# Altium footprint library nPOC-BB_alpha_main-boardd.PcbLib: 42 footprints (part 3 of 3)
Each footprint in its own frame and in the unit in brackets; x right, y up, seen from the top. Pads: shape width x height; smd on the part's side, far side on the other; paste and mask are expansions set on the pad; w line width, h text height; cw(c..) or ccw(c..) is an arc to the next point about the centre after c.
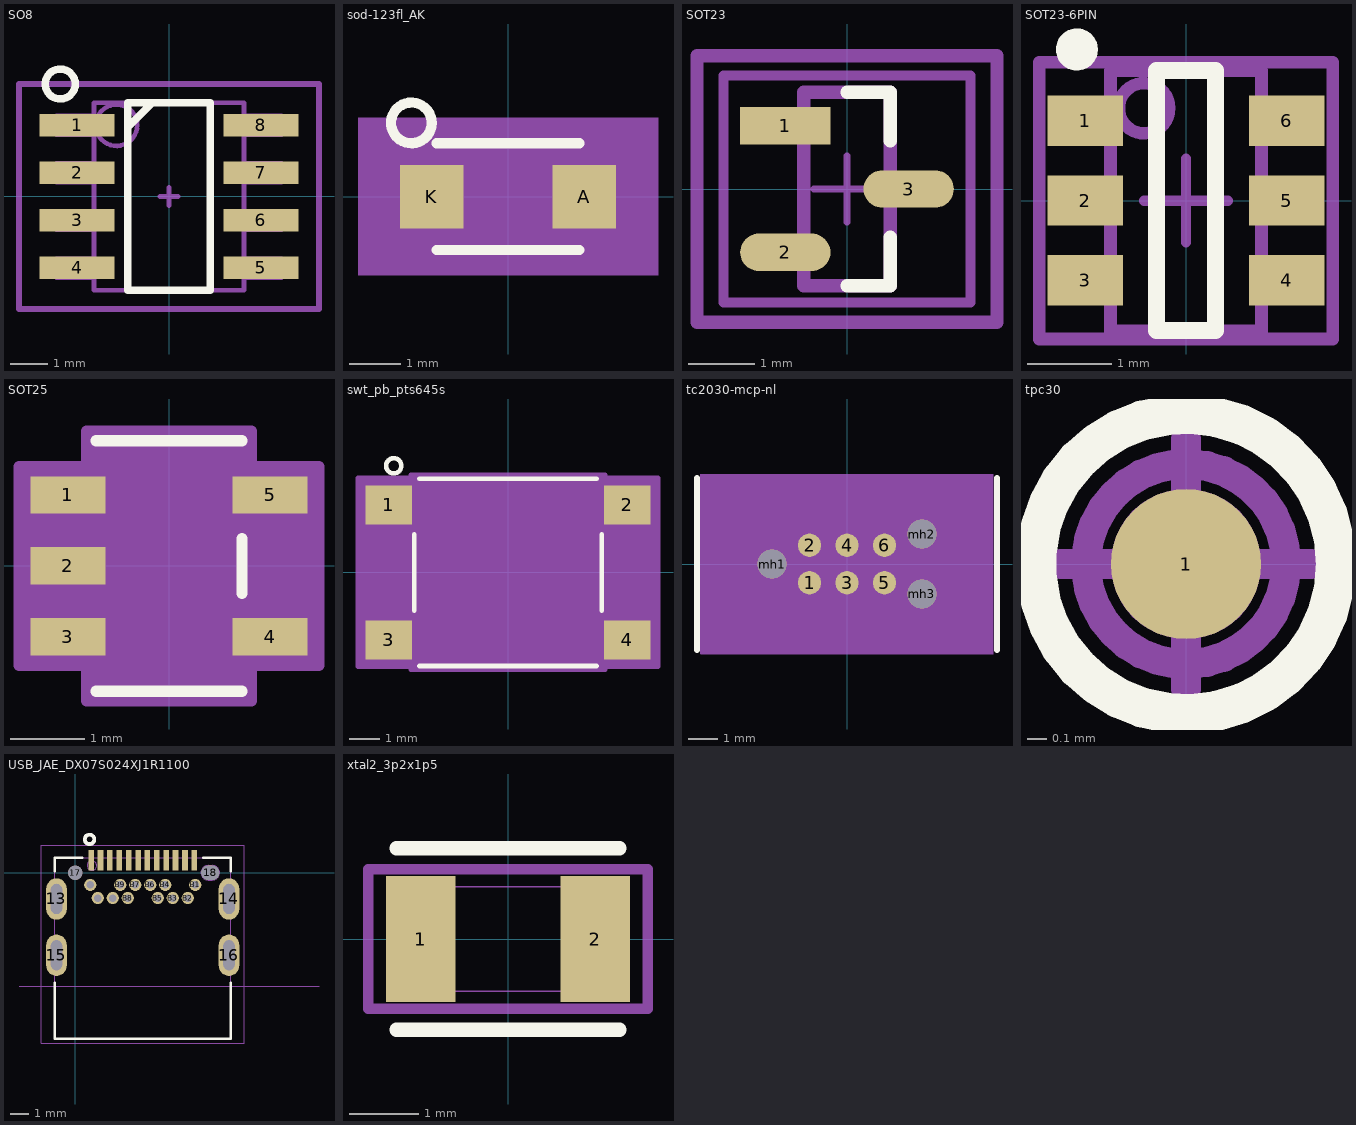
[diagram p2: the footprints below, top view; thin cyan lines are the x and y axes]

## SO8 [mm] "SOIC8"
pads (8):
  rect 2x0.6 smd: 1(-2.45,1.905) 2(-2.45,0.635) 3(-2.45,-0.635) 4(-2.45,-1.905) 5(2.45,-1.905) 6(2.45,-0.635) 7(2.45,0.635) 8(2.45,1.905)
Top Overlay:
  circle w0.2: c-2.9,3 r0.4
  lines w0.2: -1.1,1.85 -0.5,2.45 ; -1.1,-2.5 1.1,-2.5 1.1,2.5 -1.1,2.5 -1.1,-2.5
Top Assembly:
  circle w0.125: c-1.4,1.9 r0.552
  lines w0.125: -2,-2.16 -3,-2.16 -3,-1.66 -2,-1.66 ; -2,-0.89 -3,-0.89 -3,-0.39 -2,-0.39 ; -2,0.38 -3,0.38 -3,0.88 -2,0.88 ; -2,1.65 -3,1.65 -3,2.15 -2,2.15 ; 2,-2.16 3,-2.16 3,-1.66 2,-1.66 ; 2,-0.89 3,-0.89 3,-0.39 2,-0.39 ; 2,0.38 3,0.38 3,0.88 2,0.88 ; 2,1.65 3,1.65 3,2.15 2,2.15 ; -2,-2.5 2,-2.5 2,2.5 -2,2.5 -2,-2.5
Top Component Center:
  lines w0.125: -0.25,0 0.25,0 ; 0,-0.25 0,0.25
Top Courtyard:
  lines w0.15: -4,-3 4,-3 4,3 -4,3 -4,-3
3D body "SOIC-8_M.step": height 1.68, standoff 0, extent -3.099,-2.489 3.099,2.489

## sod-123fl_AK [mm] "Sod-123fl with pin A & K"
height 1.1
pads (2):
  rect 1.25x1.25 smd: A(1.5,0) K(-1.5,0)
Top Overlay:
  circle w0.2: c-1.9,1.45 r0.4
  lines w0.2: -1.4,-1.05 1.4,-1.05 ; -1.4,1.05 1.4,1.05
Top Assembly:
  lines w0.025: -1.3,-0.9 -1.3,0.9 ; -1.2,-0.9 -1.2,0.9 ; -1.1,-0.9 -1.1,0.9 ; -1,-0.9 -1,0.9 ; -0.9,-0.9 -0.9,0.9 ; -0.8,-0.9 -0.8,0.9 ; -1.45,-0.9 1.45,-0.9 1.45,0.9 -1.45,0.9 -1.45,-0.9
Top Courtyard:
  region: 2.95,-1.55 2.95,1.55 -2.95,1.55 -2.95,-1.55
3D body "SOD-123_ONS.step": height 1.35, standoff 0, extent -1.93,-0.902 1.93,0.902

## SOT23 [mm] "Sot23 3pin"
pads (3):
  rect 1.355x0.562 smd paste+0 mask+0.127: 1(-0.925,0.95)
  rrect100% 1.355x0.562 smd paste+0 mask+0.127: 2(-0.925,-0.95) 3(0.925,0)
Top Overlay:
  lines w0.2: 0,-1.45 0.65,-1.45 0.65,-0.725 ; 0,1.45 0.65,1.45 0.65,0.725
Top Assembly:
  lines w0.15: -1.853,-1.7 -1.853,1.7 1.853,1.7 1.853,-1.7 -1.853,-1.7
Top Component Center:
  lines w0.1: -0.5,0 0.5,0 ; 0,-0.5 0,0.5
Top Courtyard:
  lines w0.2: -2.25,-2 -2.25,2 2.25,2 2.25,-2 -2.25,-2
Top 3D Body:
  lines w0.2: -0.65,-1.45 -0.65,1.45 0.65,1.45 0.65,-1.45 -0.65,-1.45
3D body "Trans_Nexperia_PMV20ENR_eec.STEP": height 0.25, standoff 0, extent -1.853,-1.7 1.853,1.7

## SOT23-6PIN [mm] "SOT23, 6-Leads, Body 2.9x1.55mm, Pitch 0.95mm, IPC High Density"
height 1.45
pads (6):
  rect 0.9x0.6 smd: 1(-1.2,0.95) 2(-1.2,0) 3(-1.2,-0.95) 4(1.2,-0.95) 5(1.2,0) 6(1.2,0.95)
Top Overlay:
  circle w0.25: c-1.3,1.8 r0.125
  lines w0.2: -0.35,-1.55 0.35,-1.55 0.35,1.55 -0.35,1.55 -0.35,-1.55
Top Assembly:
  circle w0.15: c-0.5,1.1 r0.3
  lines w0.15: -0.9,-1.55 -0.9,1.55 0.9,1.55 0.9,-1.55 -0.9,-1.55
Top Component Center:
  lines w0.125: -0.5,0 0.5,0 ; 0,-0.5 0,0.5
Top Courtyard:
  lines w0.15: -1.75,-1.65 -1.75,1.65 1.75,1.65 1.75,-1.65 -1.75,-1.65
3D body "DDC0006A.stp": height 0.97, standoff 0, extent -1.4,-1.45 1.4,1.45

## SOT25 [mm] "Diodes SOT25"
height 1.3
pads (5):
  rect 1.006x0.5 smd: 1(-1.353,0.95) 2(-1.353,0) 3(-1.353,-0.95) 4(1.353,-0.95) 5(1.353,0.95)
Top Overlay:
  lines w0.152: -0.977,-1.677 0.977,-1.677 ; -0.977,1.677 0.977,1.677 ; 0.977,-0.367 0.977,0.367
Top Assembly:
  lines w0: -0.305,1.55 ccw(c0,1.55) 0.305,1.55
  lines w0.025: -1.5,-1.2 -0.85,-1.2 -0.85,-0.7 -1.5,-0.7 -1.5,-1.2 ; -1.5,-0.25 -0.85,-0.25 -0.85,0.25 -1.5,0.25 -1.5,-0.25 ; -1.5,0.7 -0.85,0.7 -0.85,1.2 -1.5,1.2 -1.5,0.7 ; -0.85,-1.55 0.85,-1.55 0.85,1.55 -0.85,1.55 -0.85,-1.55 ; 0.85,-1.2 1.5,-1.2 1.5,-0.7 0.85,-0.7 0.85,-1.2 ; 0.85,0.7 1.5,0.7 1.5,1.2 0.85,1.2 0.85,0.7
Top Courtyard:
  region: 1.104,-1.804 -1.104,-1.804 -1.104,-1.331 -2.008,-1.331 -2.008,1.331 -1.104,1.331 -1.104,1.804 1.104,1.804 1.104,1.331 2.008,1.331 2.008,-1.331 1.104,-1.331
  lines w0.152: -2.008,-1.331 -2.008,1.331 -1.104,1.331 -1.104,1.804 1.104,1.804 1.104,1.331 2.008,1.331 2.008,-1.331 1.104,-1.331 1.104,-1.804 -1.104,-1.804 -1.104,-1.331 -2.008,-1.331
3D body "SOT25_DIO.step": height 1.45, standoff 0, extent -1.5,-1.55 1.5,1.55

## swt_pb_pts645s [mm] "C&K PTS645SM43SMTR92LFS G-Type 6mm Tact Switch"
height 4.3
pads (4):
  rect 1.55x1.3 smd: 1(-3.975,2.25) 2(3.975,2.25) 3(-3.975,-2.25) 4(3.975,-2.25)
Top Overlay:
  circle w0.152: c-3.81,3.556 r0.254
  lines w0.152: -3.124,-1.278 -3.124,1.278 ; -2.957,-3.124 2.957,-3.124 ; -2.957,3.124 2.957,3.124 ; 3.124,-1.278 3.124,1.278
Top Assembly:
  circle w0.152: c0,0 r1.753
  circle w0.152: c-2.286,2.286 r0.254
  lines w0.152: -2.997,-2.997 -2.997,2.997 2.997,2.997 2.997,-2.997 -2.997,-2.997
Top Courtyard:
  region: -3.251,-3.152 -5.004,-3.152 -5.004,3.152 -3.251,3.152 -3.251,3.251 3.251,3.251 3.251,3.152 5.004,3.152 5.004,-3.152 3.251,-3.152 3.251,-3.251 -3.251,-3.251
  lines w0.152: -5.004,-3.152 -3.251,-3.152 -3.251,-3.251 3.251,-3.251 3.251,-3.152 5.004,-3.152 5.004,3.152 3.251,3.152 3.251,3.251 -3.251,3.251 -3.251,3.152 -5.004,3.152 -5.004,-3.152
3D body "PTS645SM43SMTR92LFS.stp": height 4.3, standoff 0, extent -4.5,-3 4.5,3

## tc2030-mcp-nl [mil]
pads (9):
  round 31 smd paste+0: 1(-50,-25) 2(-50,25) 3(0,-25) 4(0,25) 5(50,-25) 6(50,25)
  round 39 hole 39 unplated: mh1(-100,0) mh2(100,40) mh3(100,-40)
Top Overlay:
  lines w8: -200,-115 -200,115 ; 200,-115 200,115
Top Assembly:
  circle w1: c100,-40 r20
  circle w1: c100,40 r20
  circle w1: c50,-25 r11.18
  circle w1: c0,-25 r11.18
  circle w1: c0,25 r11.18
  circle w1: c-50,25 r11.18
  circle w1: c50,25 r11.18
  circle w1: c-100,0 r20
  lines w1: -195,-120 195,-120 195,120 -195,120 -195,-120 ; -175,-100 175,-100 175,100 -175,100 -175,-100 ; -60,-35 -40,-35 -40,-15 -60,-15 -60,-35
Top Courtyard:
  region: -195,-120 195,-120 195,120 -195,120
3D body "TC2030.stp": height 1566.93, standoff -66.93, extent -188.98,-118.11 185.04,118.11

## tpc30 [mil]
pads (1):
  round 30 smd: 1(0,0)
Top Overlay:
  circle w8: c0,0 r30
Top Assembly:
  circle w6: c0,0 r20
Top Component Center:
  lines w6: -25,0 25,0 ; 0,-25 0,25
Top Courtyard:
  region: 0,15 1.31,14.94 2.6,14.77 3.88,14.49 5.13,14.1 6.34,13.59 7.5,12.99 8.6,12.29 9.64,11.49 10.61,10.61 11.49,9.64 12.29,8.6 12.99,7.5 13.59,6.34 14.1,5.13 14.49,3.88 14.77,2.6 14.94,1.31 15,0 14.94,-1.31 14.77,-2.6 14.49,-3.88 14.1,-5.13 13.59,-6.34 12.99,-7.5 12.29,-8.6 11.49,-9.64 10.61,-10.61 9.64,-11.49 8.6,-12.29 7.5,-12.99 6.34,-13.59 5.13,-14.1 3.88,-14.49 2.6,-14.77 1.31,-14.94 0,-15 -1.31,-14.94 -2.6,-14.77 -3.88,-14.49 -5.13,-14.1 -6.34,-13.59 -7.5,-12.99 -8.6,-12.29 -9.64,-11.49 -10.61,-10.61 -11.49,-9.64 -12.29,-8.6 -12.99,-7.5 -13.59,-6.34 -14.1,-5.13 -14.49,-3.88 -14.77,-2.6 -14.94,-1.31 -15,0 -14.94,1.31 -14.77,2.6 -14.49,3.88 -14.1,5.13 -13.59,6.34 -12.99,7.5 -12.29,8.6 -11.49,9.64 -10.61,10.61 -9.64,11.49 -8.6,12.29 -7.5,12.99 -6.34,13.59 -5.13,14.1 -3.88,14.49 -2.6,14.77 -1.31,14.94
3D body: height 1, standoff 0, extent -15,-15 15,15

## USB_JAE_DX07S024XJ1R1100 [mm] "JAE - DX07S024XJ1R1100,   USB-C (USB TYPE-C) USB 3.2 Gen 2 Receptacle Connector 24 Position Surface Mount, Right Angle; Through Hole"
height 3.34
pads (30):
  oval 1.1x2.2 hole 0.6 slot 1.6 at 90 deg: 13(-1,-1.4) 14(8.2,-1.4) 15(-1,-4.4) 16(8.2,-4.4)
  round 0.75 hole 0.75 unplated: 17(0,0)
  oval 0.95x0.75 hole 0.75 slot 0.95 at 0 deg unplated: 18(7.2,0)
  rect 0.3x1.1 smd: A1(0.85,0.66) A2(1.35,0.66) A3(1.85,0.66) A4(2.35,0.66) A5(2.85,0.66) A6(3.35,0.66) A7(3.85,0.66) A8(4.35,0.66) A9(4.85,0.66) A10(5.35,0.66) A11(5.85,0.66) A12(6.35,0.66)
  round 0.65 hole 0.4: B1(6.4,-0.65) B2(6,-1.35) B3(5.2,-1.35) B4(4.8,-0.65) B5(4.4,-1.35) B6(4,-0.65) B7(3.2,-0.65) B8(2.8,-1.35) B9(2.4,-0.65) B10(2,-1.35) B11(1.2,-1.35) B12(0.8,-0.65)
Top Overlay:
  circle w0.2: c0.762,1.778 r0.254
  lines w0.127: -1.095,-5.87 -1.095,-8.85 8.295,-8.85 8.295,-5.87 ; -1.095,0.07 -1.095,0.8 0.38,0.8 ; 6.82,0.8 8.295,0.8 8.295,0.07
Mechanical 1:
  lines w0.001: 6.7,0 ccw(c7.087,0) 7.087,-0.387 7.312,-0.387 ccw(c7.312,0) 7.7,0 ccw(c7.312,0) 7.312,0.387 7.087,0.387 ccw(c7.087,0) 6.7,0
Top Assembly:
  circle w0.025: c0.889,0.381 r0.254
  lines w0.025: -3,-6.05 13,-6.05 ; -1.095,-8.85 -1.095,0.8 8.295,0.8 8.295,-8.85 -1.095,-8.85
  text "PCB EDGE" at 9.15,-5.95 h0.41
Top Courtyard:
  lines w0.05: -1.825,-9.1 -1.825,1.46 9.025,1.46 9.025,-9.1 -1.825,-9.1
3D body "DX07S024XJ1R1100--3DModel-STEP-1.STEP": height 3.45, standoff -0.65, extent -1.1,-8.85 8.3,0.91

## xtal2_3p2x1p5 [mm] "Crystal 32.768KHZ 9PF SMD"
height 0.9
pads (2):
  rect 1x1.8 smd: 1(-1.25,0) 2(1.25,0)
Top Overlay:
  lines w0.203: -1.6,-1.3 1.6,-1.3 ; -1.6,1.3 1.6,1.3
Top Assembly:
  lines w0.025: -1.6,-0.75 1.6,-0.75 1.6,0.75 -1.6,0.75 -1.6,-0.75
Top Courtyard:
  lines w0.15: -2,-1 2,-1 2,1 -2,1 -2,-1
3D body "XTAL_9HT10_TXC.step": height 0.84, standoff 0, extent -1.651,-0.8 1.651,0.8